# Altium footprint library ref-packages.PCBLIB: 1543 footprints (part 73 of 103) (continued)
## SQFP-R-20X28-176 [mil]
pads (176):
  rect 11.81x62.99 smd: 1(-501.97,-417.32) 2(-482.28,-417.32) 3(-462.6,-417.32) 4(-442.91,-417.32) 5(-423.23,-417.32) 6(-403.54,-417.32) 7(-383.86,-417.32) 8(-364.17,-417.32) 9(-344.49,-417.32) 10(-324.8,-417.32) 11(-305.12,-417.32) 12(-285.43,-417.32) 13(-265.75,-417.32) 14(-246.06,-417.32) 15(-226.38,-417.32) 16(-206.69,-417.32) 17(-187.01,-417.32) 18(-167.32,-417.32) 19(-147.64,-417.32) 20(-127.95,-417.32) 21(-108.27,-417.32) 22(-88.58,-417.32) 23(-68.9,-417.32) 24(-49.21,-417.32) 25(-29.53,-417.32) 26(-9.84,-417.32) 27(9.84,-417.32) 28(29.53,-417.32) 29(49.21,-417.32) 30(68.9,-417.32) 31(88.58,-417.32) 32(108.27,-417.32) 33(127.95,-417.32) 34(147.64,-417.32) 35(167.32,-417.32) 36(187.01,-417.32) 37(206.69,-417.32) 38(226.38,-417.32) 39(246.06,-417.32) 40(265.75,-417.32) 41(285.43,-417.32) 42(305.12,-417.32) 43(324.8,-417.32) 44(344.49,-417.32) 45(364.17,-417.32) 46(383.86,-417.32) 47(403.54,-417.32) 48(423.23,-417.32) 49(442.91,-417.32) 50(462.6,-417.32) 51(482.28,-417.32) 52(501.97,-417.32) 89(501.97,417.32) 90(482.28,417.32) 91(462.6,417.32) 92(442.91,417.32) 93(423.23,417.32) 94(403.54,417.32) 95(383.86,417.32) 96(364.17,417.32) 97(344.49,417.32) 98(324.8,417.32) 99(305.12,417.32) 100(285.43,417.32) 101(265.75,417.32) 102(246.06,417.32) 103(226.38,417.32) 104(206.69,417.32) 105(187.01,417.32) 106(167.32,417.32) 107(147.64,417.32) 108(127.95,417.32) 109(108.27,417.32) 110(88.58,417.32) 111(68.9,417.32) 112(49.21,417.32) 113(29.53,417.32) 114(9.84,417.32) 115(-9.84,417.32) 116(-29.53,417.32) 117(-49.21,417.32) 118(-68.9,417.32) 119(-88.58,417.32) 120(-108.27,417.32) 121(-127.95,417.32) 122(-147.64,417.32) 123(-167.32,417.32) 124(-187.01,417.32) 125(-206.69,417.32) 126(-226.38,417.32) 127(-246.06,417.32) 128(-265.75,417.32) 129(-285.43,417.32) 130(-305.12,417.32) 131(-324.8,417.32) 132(-344.49,417.32) 133(-364.17,417.32) 134(-383.86,417.32) 135(-403.54,417.32) 136(-423.23,417.32) 137(-442.91,417.32) 138(-462.6,417.32) 139(-482.28,417.32) 140(-501.97,417.32)
  rect 62.99x11.81 smd: 53(574.8,-344.49) 54(574.8,-324.8) 55(574.8,-305.12) 56(574.8,-285.43) 57(574.8,-265.75) 58(574.8,-246.06) 59(574.8,-226.38) 60(574.8,-206.69) 61(574.8,-187.01) 62(574.8,-167.32) 63(574.8,-147.64) 64(574.8,-127.95) 65(574.8,-108.27) 66(574.8,-88.58) 67(574.8,-68.9) 68(574.8,-49.21) 69(574.8,-29.53) 70(574.8,-9.84) 71(574.8,9.84) 72(574.8,29.53) 73(574.8,49.21) 74(574.8,68.9) 75(574.8,88.58) 76(574.8,108.27) 77(574.8,127.95) 78(574.8,147.64) 79(574.8,167.32) 80(574.8,187.01) 81(574.8,206.69) 82(574.8,226.38) 83(574.8,246.06) 84(574.8,265.75) 85(574.8,285.43) 86(574.8,305.12) 87(574.8,324.8) 88(574.8,344.49) 141(-574.8,344.49) 142(-574.8,324.8) 143(-574.8,305.12) 144(-574.8,285.43) 145(-574.8,265.75) 146(-574.8,246.06) 147(-574.8,226.38) 148(-574.8,206.69) 149(-574.8,187.01) 150(-574.8,167.32) 151(-574.8,147.64) 152(-574.8,127.95) 153(-574.8,108.27) 154(-574.8,88.58) 155(-574.8,68.9) 156(-574.8,49.21) 157(-574.8,29.53) 158(-574.8,9.84) 159(-574.8,-9.84) 160(-574.8,-29.53) 161(-574.8,-49.21) 162(-574.8,-68.9) 163(-574.8,-88.58) 164(-574.8,-108.27) 165(-574.8,-127.95) 166(-574.8,-147.64) 167(-574.8,-167.32) 168(-574.8,-187.01) 169(-574.8,-206.69) 170(-574.8,-226.38) 171(-574.8,-246.06) 172(-574.8,-265.75) 173(-574.8,-285.43) 174(-574.8,-305.12) 175(-574.8,-324.8) 176(-574.8,-344.49)
Top Overlay:
  circle w10: c-482.28,-334.65 r29.52
  lines w8: -534.25,-376.38 533.86,-376.38 533.86,376.38 -534.25,376.38 -534.25,-376.38
Mechanical 16:
  drawing of 180 lines, arcs and shapes, not listed
Mechanical 27:
  lines w7.87: -645.67,-468.5 -645.67,468.5 645.67,468.5 645.67,-468.5 -645.67,-468.5

## SQFP-R-20X28-184 [mil]
pads (184):
  rect 11.81x62.99 smd: 1(-521.65,-417.32) 2(-501.97,-417.32) 3(-482.28,-417.32) 4(-462.6,-417.32) 5(-442.91,-417.32) 6(-423.23,-417.32) 7(-403.54,-417.32) 8(-383.86,-417.32) 9(-364.17,-417.32) 10(-344.49,-417.32) 11(-324.8,-417.32) 12(-305.12,-417.32) 13(-285.43,-417.32) 14(-265.75,-417.32) 15(-246.06,-417.32) 16(-226.38,-417.32) 17(-206.69,-417.32) 18(-187.01,-417.32) 19(-167.32,-417.32) 20(-147.64,-417.32) 21(-127.95,-417.32) 22(-108.27,-417.32) 23(-88.58,-417.32) 24(-68.9,-417.32) 25(-49.21,-417.32) 26(-29.53,-417.32) 27(-9.84,-417.32) 28(9.84,-417.32) 29(29.53,-417.32) 30(49.21,-417.32) 31(68.9,-417.32) 32(88.58,-417.32) 33(108.27,-417.32) 34(127.95,-417.32) 35(147.64,-417.32) 36(167.32,-417.32) 37(187.01,-417.32) 38(206.69,-417.32) 39(226.38,-417.32) 40(246.06,-417.32) 41(265.75,-417.32) 42(285.43,-417.32) 43(305.12,-417.32) 44(324.8,-417.32) 45(344.49,-417.32) 46(364.17,-417.32) 47(383.86,-417.32) 48(403.54,-417.32) 49(423.23,-417.32) 50(442.91,-417.32) 51(462.6,-417.32) 52(482.28,-417.32) 53(501.97,-417.32) 54(521.65,-417.32) 93(521.65,417.32) 94(501.97,417.32) 95(482.28,417.32) 96(462.6,417.32) 97(442.91,417.32) 98(423.23,417.32) 99(403.54,417.32) 100(383.86,417.32) 101(364.17,417.32) 102(344.49,417.32) 103(324.8,417.32) 104(305.12,417.32) 105(285.43,417.32) 106(265.75,417.32) 107(246.06,417.32) 108(226.38,417.32) 109(206.69,417.32) 110(187.01,417.32) 111(167.32,417.32) 112(147.64,417.32) 113(127.95,417.32) 114(108.27,417.32) 115(88.58,417.32) 116(68.9,417.32) 117(49.21,417.32) 118(29.53,417.32) 119(9.84,417.32) 120(-9.84,417.32) 121(-29.53,417.32) 122(-49.21,417.32) 123(-68.9,417.32) 124(-88.58,417.32) 125(-108.27,417.32) 126(-127.95,417.32) 127(-147.64,417.32) 128(-167.32,417.32) 129(-187.01,417.32) 130(-206.69,417.32) 131(-226.38,417.32) 132(-246.06,417.32) 133(-265.75,417.32) 134(-285.43,417.32) 135(-305.12,417.32) 136(-324.8,417.32) 137(-344.49,417.32) 138(-364.17,417.32) 139(-383.86,417.32) 140(-403.54,417.32) 141(-423.23,417.32) 142(-442.91,417.32) 143(-462.6,417.32) 144(-482.28,417.32) 145(-501.97,417.32) 146(-521.65,417.32)
  rect 62.99x11.81 smd: 55(574.8,-364.17) 56(574.8,-344.49) 57(574.8,-324.8) 58(574.8,-305.12) 59(574.8,-285.43) 60(574.8,-265.75) 61(574.8,-246.06) 62(574.8,-226.38) 63(574.8,-206.69) 64(574.8,-187.01) 65(574.8,-167.32) 66(574.8,-147.64) 67(574.8,-127.95) 68(574.8,-108.27) 69(574.8,-88.58) 70(574.8,-68.9) 71(574.8,-49.21) 72(574.8,-29.53) 73(574.8,-9.84) 74(574.8,9.84) 75(574.8,29.53) 76(574.8,49.21) 77(574.8,68.9) 78(574.8,88.58) 79(574.8,108.27) 80(574.8,127.95) 81(574.8,147.64) 82(574.8,167.32) 83(574.8,187.01) 84(574.8,206.69) 85(574.8,226.38) 86(574.8,246.06) 87(574.8,265.75) 88(574.8,285.43) 89(574.8,305.12) 90(574.8,324.8) 91(574.8,344.49) 92(574.8,364.17) 147(-574.8,364.17) 148(-574.8,344.49) 149(-574.8,324.8) 150(-574.8,305.12) 151(-574.8,285.43) 152(-574.8,265.75) 153(-574.8,246.06) 154(-574.8,226.38) 155(-574.8,206.69) 156(-574.8,187.01) 157(-574.8,167.32) 158(-574.8,147.64) 159(-574.8,127.95) 160(-574.8,108.27) 161(-574.8,88.58) 162(-574.8,68.9) 163(-574.8,49.21) 164(-574.8,29.53) 165(-574.8,9.84) 166(-574.8,-9.84) 167(-574.8,-29.53) 168(-574.8,-49.21) 169(-574.8,-68.9) 170(-574.8,-88.58) 171(-574.8,-108.27) 172(-574.8,-127.95) 173(-574.8,-147.64) 174(-574.8,-167.32) 175(-574.8,-187.01) 176(-574.8,-206.69) 177(-574.8,-226.38) 178(-574.8,-246.06) 179(-574.8,-265.75) 180(-574.8,-285.43) 181(-574.8,-305.12) 182(-574.8,-324.8) 183(-574.8,-344.49) 184(-574.8,-364.17)
Top Overlay:
  circle w10: c-482.28,-334.65 r29.52
  lines w8: -534.25,-376.38 533.86,-376.38 533.86,376.38 -534.25,376.38 -534.25,-376.38
Mechanical 16:
  drawing of 188 lines, arcs and shapes, not listed
Mechanical 27:
  lines w7.87: -645.67,-468.5 -645.67,468.5 645.67,468.5 645.67,-468.5 -645.67,-468.5

## SQFP-R-20X28-224 [mm]
pads (224):
  rect 0.25x1.6 smd: 1(-13,-10.6) 2(-12.6,-10.6) 3(-12.2,-10.6) 4(-11.8,-10.6) 5(-11.4,-10.6) 6(-11,-10.6) 7(-10.6,-10.6) 8(-10.2,-10.6) 9(-9.8,-10.6) 10(-9.4,-10.6) 11(-9,-10.6) 12(-8.6,-10.6) 13(-8.2,-10.6) 14(-7.8,-10.6) 15(-7.4,-10.6) 16(-7,-10.6) 17(-6.6,-10.6) 18(-6.2,-10.6) 19(-5.8,-10.6) 20(-5.4,-10.6) 21(-5,-10.6) 22(-4.6,-10.6) 23(-4.2,-10.6) 24(-3.8,-10.6) 25(-3.4,-10.6) 26(-3,-10.6) 27(-2.6,-10.6) 28(-2.2,-10.6) 29(-1.8,-10.6) 30(-1.4,-10.6) 31(-1,-10.6) 32(-0.6,-10.6) 33(-0.2,-10.6) 34(0.2,-10.6) 35(0.6,-10.6) 36(1,-10.6) 37(1.4,-10.6) 38(1.8,-10.6) 39(2.2,-10.6) 40(2.6,-10.6) 41(3,-10.6) 42(3.4,-10.6) 43(3.8,-10.6) 44(4.2,-10.6) 45(4.6,-10.6) 46(5,-10.6) 47(5.4,-10.6) 48(5.8,-10.6) 49(6.2,-10.6) 50(6.6,-10.6) 51(7,-10.6) 52(7.4,-10.6) 53(7.8,-10.6) 54(8.2,-10.6) 55(8.6,-10.6) 56(9,-10.6) 57(9.4,-10.6) 58(9.8,-10.6) 59(10.2,-10.6) 60(10.6,-10.6) 61(11,-10.6) 62(11.4,-10.6) 63(11.8,-10.6) 64(12.2,-10.6) 65(12.6,-10.6) 66(13,-10.6) 113(13,10.6) 114(12.6,10.6) 115(12.2,10.6) 116(11.8,10.6) 117(11.4,10.6) 118(11,10.6) 119(10.6,10.6) 120(10.2,10.6) 121(9.8,10.6) 122(9.4,10.6) 123(9,10.6) 124(8.6,10.6) 125(8.2,10.6) 126(7.8,10.6) 127(7.4,10.6) 128(7,10.6) 129(6.6,10.6) 130(6.2,10.6) 131(5.8,10.6) 132(5.4,10.6) 133(5,10.6) 134(4.6,10.6) 135(4.2,10.6) 136(3.8,10.6) 137(3.4,10.6) 138(3,10.6) 139(2.6,10.6) 140(2.2,10.6) 141(1.8,10.6) 142(1.4,10.6) 143(1,10.6) 144(0.6,10.6) 145(0.2,10.6) 146(-0.2,10.6) 147(-0.6,10.6) 148(-1,10.6) 149(-1.4,10.6) 150(-1.8,10.6) 151(-2.2,10.6) 152(-2.6,10.6) 153(-3,10.6) 154(-3.4,10.6) 155(-3.8,10.6) 156(-4.2,10.6) 157(-4.6,10.6) 158(-5,10.6) 159(-5.4,10.6) 160(-5.8,10.6) 161(-6.2,10.6) 162(-6.6,10.6) 163(-7,10.6) 164(-7.4,10.6) 165(-7.8,10.6) 166(-8.2,10.6) 167(-8.6,10.6) 168(-9,10.6) 169(-9.4,10.6) 170(-9.8,10.6) 171(-10.2,10.6) 172(-10.6,10.6) 173(-11,10.6) 174(-11.4,10.6) 175(-11.8,10.6) 176(-12.2,10.6) 177(-12.6,10.6) 178(-13,10.6)
  rect 1.6x0.25 smd: 67(14.6,-9) 68(14.6,-8.6) 69(14.6,-8.2) 70(14.6,-7.8) 71(14.6,-7.4) 72(14.6,-7) 73(14.6,-6.6) 74(14.6,-6.2) 75(14.6,-5.8) 76(14.6,-5.4) 77(14.6,-5) 78(14.6,-4.6) 79(14.6,-4.2) 80(14.6,-3.8) 81(14.6,-3.4) 82(14.6,-3) 83(14.6,-2.6) 84(14.6,-2.2) 85(14.6,-1.8) 86(14.6,-1.4) 87(14.6,-1) 88(14.6,-0.6) 89(14.6,-0.2) 90(14.6,0.2) 91(14.6,0.6) 92(14.6,1) 93(14.6,1.4) 94(14.6,1.8) 95(14.6,2.2) 96(14.6,2.6) 97(14.6,3) 98(14.6,3.4) 99(14.6,3.8) 100(14.6,4.2) 101(14.6,4.6) 102(14.6,5) 103(14.6,5.4) 104(14.6,5.8) 105(14.6,6.2) 106(14.6,6.6) 107(14.6,7) 108(14.6,7.4) 109(14.6,7.8) 110(14.6,8.2) 111(14.6,8.6) 112(14.6,9) 179(-14.6,9) 180(-14.6,8.6) 181(-14.6,8.2) 182(-14.6,7.8) 183(-14.6,7.4) 184(-14.6,7) 185(-14.6,6.6) 186(-14.6,6.2) 187(-14.6,5.8) 188(-14.6,5.4) 189(-14.6,5) 190(-14.6,4.6) 191(-14.6,4.2) 192(-14.6,3.8) 193(-14.6,3.4) 194(-14.6,3) 195(-14.6,2.6) 196(-14.6,2.2) 197(-14.6,1.8) 198(-14.6,1.4) 199(-14.6,1) 200(-14.6,0.6) 201(-14.6,0.2) 202(-14.6,-0.2) 203(-14.6,-0.6) 204(-14.6,-1) 205(-14.6,-1.4) 206(-14.6,-1.8) 207(-14.6,-2.2) 208(-14.6,-2.6) 209(-14.6,-3) 210(-14.6,-3.4) 211(-14.6,-3.8) 212(-14.6,-4.2) 213(-14.6,-4.6) 214(-14.6,-5) 215(-14.6,-5.4) 216(-14.6,-5.8) 217(-14.6,-6.2) 218(-14.6,-6.6) 219(-14.6,-7) 220(-14.6,-7.4) 221(-14.6,-7.8) 222(-14.6,-8.2) 223(-14.6,-8.6) 224(-14.6,-9)
Top Overlay:
  circle w0.254: c-12.25,-8.5 r0.75
  lines w0.203: -13.57,-9.56 13.56,-9.56 13.56,9.56 -13.57,9.56 -13.57,-9.56
Mechanical 16:
  drawing of 228 lines, arcs and shapes, not listed
Mechanical 27:
  lines w0.2: -16.4,-11.9 -16.4,11.9 16.4,11.9 16.4,-11.9 -16.4,-11.9

## SQFP-R-20X28-232 [mm]
pads (232):
  rect 0.25x1.6 smd: 1(-13.4,-10.6) 2(-13,-10.6) 3(-12.6,-10.6) 4(-12.2,-10.6) 5(-11.8,-10.6) 6(-11.4,-10.6) 7(-11,-10.6) 8(-10.6,-10.6) 9(-10.2,-10.6) 10(-9.8,-10.6) 11(-9.4,-10.6) 12(-9,-10.6) 13(-8.6,-10.6) 14(-8.2,-10.6) 15(-7.8,-10.6) 16(-7.4,-10.6) 17(-7,-10.6) 18(-6.6,-10.6) 19(-6.2,-10.6) 20(-5.8,-10.6) 21(-5.4,-10.6) 22(-5,-10.6) 23(-4.6,-10.6) 24(-4.2,-10.6) 25(-3.8,-10.6) 26(-3.4,-10.6) 27(-3,-10.6) 28(-2.6,-10.6) 29(-2.2,-10.6) 30(-1.8,-10.6) 31(-1.4,-10.6) 32(-1,-10.6) 33(-0.6,-10.6) 34(-0.2,-10.6) 35(0.2,-10.6) 36(0.6,-10.6) 37(1,-10.6) 38(1.4,-10.6) 39(1.8,-10.6) 40(2.2,-10.6) 41(2.6,-10.6) 42(3,-10.6) 43(3.4,-10.6) 44(3.8,-10.6) 45(4.2,-10.6) 46(4.6,-10.6) 47(5,-10.6) 48(5.4,-10.6) 49(5.8,-10.6) 50(6.2,-10.6) 51(6.6,-10.6) 52(7,-10.6) 53(7.4,-10.6) 54(7.8,-10.6) 55(8.2,-10.6) 56(8.6,-10.6) 57(9,-10.6) 58(9.4,-10.6) 59(9.8,-10.6) 60(10.2,-10.6) 61(10.6,-10.6) 62(11,-10.6) 63(11.4,-10.6) 64(11.8,-10.6) 65(12.2,-10.6) 66(12.6,-10.6) 67(13,-10.6) 68(13.4,-10.6) 117(13.4,10.6) 118(13,10.6) 119(12.6,10.6) 120(12.2,10.6) 121(11.8,10.6) 122(11.4,10.6) 123(11,10.6) 124(10.6,10.6) 125(10.2,10.6) 126(9.8,10.6) 127(9.4,10.6) 128(9,10.6) 129(8.6,10.6) 130(8.2,10.6) 131(7.8,10.6) 132(7.4,10.6) 133(7,10.6) 134(6.6,10.6) 135(6.2,10.6) 136(5.8,10.6) 137(5.4,10.6) 138(5,10.6) 139(4.6,10.6) 140(4.2,10.6) 141(3.8,10.6) 142(3.4,10.6) 143(3,10.6) 144(2.6,10.6) 145(2.2,10.6) 146(1.8,10.6) 147(1.4,10.6) 148(1,10.6) 149(0.6,10.6) 150(0.2,10.6) 151(-0.2,10.6) 152(-0.6,10.6) 153(-1,10.6) 154(-1.4,10.6) 155(-1.8,10.6) 156(-2.2,10.6) 157(-2.6,10.6) 158(-3,10.6) 159(-3.4,10.6) 160(-3.8,10.6) 161(-4.2,10.6) 162(-4.6,10.6) 163(-5,10.6) 164(-5.4,10.6) 165(-5.8,10.6) 166(-6.2,10.6) 167(-6.6,10.6) 168(-7,10.6) 169(-7.4,10.6) 170(-7.8,10.6) 171(-8.2,10.6) 172(-8.6,10.6) 173(-9,10.6) 174(-9.4,10.6) 175(-9.8,10.6) 176(-10.2,10.6) 177(-10.6,10.6) 178(-11,10.6) 179(-11.4,10.6) 180(-11.8,10.6) 181(-12.2,10.6) 182(-12.6,10.6) 183(-13,10.6) 184(-13.4,10.6)
  rect 1.6x0.25 smd: 69(14.6,-9.4) 70(14.6,-9) 71(14.6,-8.6) 72(14.6,-8.2) 73(14.6,-7.8) 74(14.6,-7.4) 75(14.6,-7) 76(14.6,-6.6) 77(14.6,-6.2) 78(14.6,-5.8) 79(14.6,-5.4) 80(14.6,-5) 81(14.6,-4.6) 82(14.6,-4.2) 83(14.6,-3.8) 84(14.6,-3.4) 85(14.6,-3) 86(14.6,-2.6) 87(14.6,-2.2) 88(14.6,-1.8) 89(14.6,-1.4) 90(14.6,-1) 91(14.6,-0.6) 92(14.6,-0.2) 93(14.6,0.2) 94(14.6,0.6) 95(14.6,1) 96(14.6,1.4) 97(14.6,1.8) 98(14.6,2.2) 99(14.6,2.6) 100(14.6,3) 101(14.6,3.4) 102(14.6,3.8) 103(14.6,4.2) 104(14.6,4.6) 105(14.6,5) 106(14.6,5.4) 107(14.6,5.8) 108(14.6,6.2) 109(14.6,6.6) 110(14.6,7) 111(14.6,7.4) 112(14.6,7.8) 113(14.6,8.2) 114(14.6,8.6) 115(14.6,9) 116(14.6,9.4) 185(-14.6,9.4) 186(-14.6,9) 187(-14.6,8.6) 188(-14.6,8.2) 189(-14.6,7.8) 190(-14.6,7.4) 191(-14.6,7) 192(-14.6,6.6) 193(-14.6,6.2) 194(-14.6,5.8) 195(-14.6,5.4) 196(-14.6,5) 197(-14.6,4.6) 198(-14.6,4.2) 199(-14.6,3.8) 200(-14.6,3.4) 201(-14.6,3) 202(-14.6,2.6) 203(-14.6,2.2) 204(-14.6,1.8) 205(-14.6,1.4) 206(-14.6,1) 207(-14.6,0.6) 208(-14.6,0.2) 209(-14.6,-0.2) 210(-14.6,-0.6) 211(-14.6,-1) 212(-14.6,-1.4) 213(-14.6,-1.8) 214(-14.6,-2.2) 215(-14.6,-2.6) 216(-14.6,-3) 217(-14.6,-3.4) 218(-14.6,-3.8) 219(-14.6,-4.2) 220(-14.6,-4.6) 221(-14.6,-5) 222(-14.6,-5.4) 223(-14.6,-5.8) 224(-14.6,-6.2) 225(-14.6,-6.6) 226(-14.6,-7) 227(-14.6,-7.4) 228(-14.6,-7.8) 229(-14.6,-8.2) 230(-14.6,-8.6) 231(-14.6,-9) 232(-14.6,-9.4)
Top Overlay:
  circle w0.254: c-12.25,-8.5 r0.75
  lines w0.203: -13.57,-9.56 13.56,-9.56 13.56,9.56 -13.57,9.56 -13.57,-9.56
Mechanical 16:
  drawing of 236 lines, arcs and shapes, not listed
Mechanical 27:
  lines w0.2: -16.4,-11.9 -16.4,11.9 16.4,11.9 16.4,-11.9 -16.4,-11.9

## SQFP-R-20X28-300 [mm]
pads (300):
  rect 0.17x1.6 smd: 1(-13.05,-10.6) 2(-12.75,-10.6) 3(-12.45,-10.6) 4(-12.15,-10.6) 5(-11.85,-10.6) 6(-11.55,-10.6) 7(-11.25,-10.6) 8(-10.95,-10.6) 9(-10.65,-10.6) 10(-10.35,-10.6) 11(-10.05,-10.6) 12(-9.75,-10.6) 13(-9.45,-10.6) 14(-9.15,-10.6) 15(-8.85,-10.6) 16(-8.55,-10.6) 17(-8.25,-10.6) 18(-7.95,-10.6) 19(-7.65,-10.6) 20(-7.35,-10.6) 21(-7.05,-10.6) 22(-6.75,-10.6) 23(-6.45,-10.6) 24(-6.15,-10.6) 25(-5.85,-10.6) 26(-5.55,-10.6) 27(-5.25,-10.6) 28(-4.95,-10.6) 29(-4.65,-10.6) 30(-4.35,-10.6) 31(-4.05,-10.6) 32(-3.75,-10.6) 33(-3.45,-10.6) 34(-3.15,-10.6) 35(-2.85,-10.6) 36(-2.55,-10.6) 37(-2.25,-10.6) 38(-1.95,-10.6) 39(-1.65,-10.6) 40(-1.35,-10.6) 41(-1.05,-10.6) 42(-0.75,-10.6) 43(-0.45,-10.6) 44(-0.15,-10.6) 45(0.15,-10.6) 46(0.45,-10.6) 47(0.75,-10.6) 48(1.05,-10.6) 49(1.35,-10.6) 50(1.65,-10.6) 51(1.95,-10.6) 52(2.25,-10.6) 53(2.55,-10.6) 54(2.85,-10.6) 55(3.15,-10.6) 56(3.45,-10.6) 57(3.75,-10.6) 58(4.05,-10.6) 59(4.35,-10.6) 60(4.65,-10.6) 61(4.95,-10.6) 62(5.25,-10.6) 63(5.55,-10.6) 64(5.85,-10.6) 65(6.15,-10.6) 66(6.45,-10.6) 67(6.75,-10.6) 68(7.05,-10.6) 69(11.55,-10.6) 70(7.35,-10.6) 71(7.65,-10.6) 72(7.95,-10.6) 73(8.25,-10.6) 74(8.55,-10.6) 75(8.85,-10.6) 76(9.15,-10.6) 77(9.45,-10.6) 78(9.75,-10.6) 79(10.05,-10.6) 80(10.35,-10.6) 81(10.65,-10.6) 82(10.95,-10.6) 83(11.25,-10.6) 84(11.85,-10.6) 85(12.15,-10.6) 86(12.45,-10.6) 87(12.75,-10.6) 88(13.05,-10.6) 151(13.05,10.6) 152(12.75,10.6) 153(12.45,10.6) 154(12.15,10.6) 155(11.85,10.6) 156(11.55,10.6) 157(11.25,10.6) 158(10.95,10.6) 159(10.65,10.6) 160(10.35,10.6) 161(10.05,10.6) 162(9.75,10.6) 163(9.45,10.6) 164(9.15,10.6) 165(8.85,10.6) 166(8.55,10.6) 167(8.25,10.6) 168(7.95,10.6) 169(7.65,10.6) 170(7.35,10.6) 171(7.05,10.6) 172(6.75,10.6) 173(6.45,10.6) 174(6.15,10.6) 175(5.85,10.6) 176(5.55,10.6) 177(5.25,10.6) 178(4.95,10.6) 179(4.65,10.6) 180(4.35,10.6) 181(4.05,10.6) 182(3.75,10.6) 183(3.45,10.6) 184(3.15,10.6) 185(2.85,10.6) 186(2.55,10.6) 187(2.25,10.6) 188(1.95,10.6) 189(1.65,10.6) 190(1.35,10.6) 191(1.05,10.6) 192(0.75,10.6) 193(0.45,10.6) 194(0.15,10.6) 195(-0.15,10.6) 196(-0.45,10.6) 197(-0.75,10.6) 198(-1.05,10.6) 199(-1.35,10.6) 200(-1.65,10.6) 201(-1.95,10.6) 202(-2.25,10.6) 203(-2.55,10.6) 204(-2.85,10.6) 205(-3.15,10.6) 206(-3.45,10.6) 207(-3.75,10.6) 208(-4.05,10.6) 209(-4.35,10.6) 210(-4.65,10.6) 211(-4.95,10.6) 212(-5.25,10.6) 213(-5.55,10.6) 214(-5.85,10.6) 215(-6.15,10.6) 216(-6.45,10.6) 217(-6.75,10.6) 218(-7.05,10.6) 219(-7.35,10.6) 220(-7.65,10.6) 221(-7.95,10.6) 222(-8.25,10.6) 223(-8.55,10.6) 224(-8.85,10.6) 225(-9.15,10.6) 226(-9.45,10.6) 227(-9.75,10.6) 228(-10.05,10.6) 229(-10.35,10.6) 230(-10.65,10.6) 231(-10.95,10.6) 232(-11.25,10.6) 233(-11.55,10.6) 234(-11.85,10.6) 235(-12.15,10.6) 236(-12.45,10.6) 237(-12.75,10.6) 238(-13.05,10.6)
  rect 1.6x0.17 smd: 89(14.6,-9.15) 90(14.6,-8.85) 91(14.6,-8.55) 92(14.6,-8.25) 93(14.6,-7.95) 94(14.6,-7.65) 95(14.6,-7.35) 96(14.6,-7.05) 97(14.6,-6.75) 98(14.6,-6.45) 99(14.6,-6.15) 100(14.6,-5.85) 101(14.6,-5.55) 102(14.6,-5.25) 103(14.6,-4.95) 104(14.6,-4.65) 105(14.6,-4.35) 106(14.6,-4.05) 107(14.6,-3.75) 108(14.6,-3.45) 109(14.6,-3.15) 110(14.6,-2.85) 111(14.6,-2.55) 112(14.6,-2.25) 113(14.6,-1.95) 114(14.6,-1.65) 115(14.6,-1.35) 116(14.6,-1.05) 117(14.6,-0.75) 118(14.6,-0.45) 119(14.6,-0.15) 120(14.6,0.15) 121(14.6,0.45) 122(14.6,0.75) 123(14.6,1.05) 124(14.6,1.35) 125(14.6,1.65) 126(14.6,1.95) 127(14.6,2.25) 128(14.6,2.55) 129(14.6,2.85) 130(14.6,3.15) 131(14.6,3.45) 132(14.6,3.75) 133(14.6,4.05) 134(14.6,4.35) 135(14.6,4.65) 136(14.6,4.95) 137(14.6,5.25) 138(14.6,5.55) 139(14.6,5.85) 140(14.6,6.15) 141(14.6,6.45) 142(14.6,6.75) 143(14.6,7.05) 144(14.6,7.35) 145(14.6,7.65) 146(14.6,7.95) 147(14.6,8.25) 148(14.6,8.55) 149(14.6,8.85) 150(14.6,9.15) 239(-14.6,9.15) 240(-14.6,8.85) 241(-14.6,8.55) 242(-14.6,8.25) 243(-14.6,7.95) 244(-14.6,7.65) 245(-14.6,7.35) 246(-14.6,7.05) 247(-14.6,6.75) 248(-14.6,6.45) 249(-14.6,6.15) 250(-14.6,5.85) 251(-14.6,5.55) 252(-14.6,5.25) 253(-14.6,4.95) 254(-14.6,4.65) 255(-14.6,4.35) 256(-14.6,4.05) 257(-14.6,3.75) 258(-14.6,3.45) 259(-14.6,3.15) 260(-14.6,2.85) 261(-14.6,2.55) 262(-14.6,2.25) 263(-14.6,1.95) 264(-14.6,1.65) 265(-14.6,1.35) 266(-14.6,1.05) 267(-14.6,0.75) 268(-14.6,0.45) 269(-14.6,0.15) 270(-14.6,-0.15) 271(-14.6,-0.45) 272(-14.6,-0.75) 273(-14.6,-1.05) 274(-14.6,-1.35) 275(-14.6,-1.65) 276(-14.6,-1.95) 277(-14.6,-2.25) 278(-14.6,-2.55) 279(-14.6,-2.85) 280(-14.6,-3.15) 281(-14.6,-3.45) 282(-14.6,-3.75) 283(-14.6,-4.05) 284(-14.6,-4.35) 285(-14.6,-4.65) 286(-14.6,-4.95) 287(-14.6,-5.25) 288(-14.6,-5.55) 289(-14.6,-5.85) 290(-14.6,-6.15) 291(-14.6,-6.45) 292(-14.6,-6.75) 293(-14.6,-7.05) 294(-14.6,-7.35) 295(-14.6,-7.65) 296(-14.6,-7.95) 297(-14.6,-8.25) 298(-14.6,-8.55) 299(-14.6,-8.85) 300(-14.6,-9.15)
Top Overlay:
  circle w0.254: c-12.25,-8.5 r0.75
  lines w0.203: -13.57,-9.56 13.56,-9.56 13.56,9.56 -13.57,9.56 -13.57,-9.56
Mechanical 16:
  drawing of 304 lines, arcs and shapes, not listed
Mechanical 27:
  lines w0.2: -16.4,-11.9 -16.4,11.9 16.4,11.9 16.4,-11.9 -16.4,-11.9

## SQFP-R-20X28-308 [mm]
pads (308):
  rect 0.17x1.6 smd: 1(-13.35,-10.6) 2(-13.05,-10.6) 3(-12.75,-10.6) 4(-12.45,-10.6) 5(-12.15,-10.6) 6(-11.85,-10.6) 7(-11.55,-10.6) 8(-11.25,-10.6) 9(-10.95,-10.6) 10(-10.65,-10.6) 11(-10.35,-10.6) 12(-10.05,-10.6) 13(-9.75,-10.6) 14(-9.45,-10.6) 15(-9.15,-10.6) 16(-8.85,-10.6) 17(-8.55,-10.6) 18(-8.25,-10.6) 19(-7.95,-10.6) 20(-7.65,-10.6) 21(-7.35,-10.6) 22(-7.05,-10.6) 23(-6.75,-10.6) 24(-6.45,-10.6) 25(-6.15,-10.6) 26(-5.85,-10.6) 27(-5.55,-10.6) 28(-5.25,-10.6) 29(-4.95,-10.6) 30(-4.65,-10.6) 31(-4.35,-10.6) 32(-4.05,-10.6) 33(-3.75,-10.6) 34(-3.45,-10.6) 35(-3.15,-10.6) 36(-2.85,-10.6) 37(-2.55,-10.6) 38(-2.25,-10.6) 39(-1.95,-10.6) 40(-1.65,-10.6) 41(-1.35,-10.6) 42(-1.05,-10.6) 43(-0.75,-10.6) 44(-0.45,-10.6) 45(-0.15,-10.6) 46(0.15,-10.6) 47(0.45,-10.6) 48(0.75,-10.6) 49(1.05,-10.6) 50(1.35,-10.6) 51(1.65,-10.6) 52(1.95,-10.6) 53(2.25,-10.6) 54(2.55,-10.6) 55(2.85,-10.6) 56(3.15,-10.6) 57(3.45,-10.6) 58(3.75,-10.6) 59(4.05,-10.6) 60(4.35,-10.6) 61(4.65,-10.6) 62(4.95,-10.6) 63(5.25,-10.6) 64(5.55,-10.6) 65(5.85,-10.6) 66(6.15,-10.6) 67(6.45,-10.6) 68(6.75,-10.6) 69(11.25,-10.6) 70(7.05,-10.6) 71(7.35,-10.6) 72(7.65,-10.6) 73(7.95,-10.6) 74(8.25,-10.6) 75(8.55,-10.6) 76(8.85,-10.6) 77(9.15,-10.6) 78(9.45,-10.6) 79(9.75,-10.6) 80(10.05,-10.6) 81(10.35,-10.6) 82(10.65,-10.6) 83(10.95,-10.6) 84(11.55,-10.6) 85(11.85,-10.6) 86(12.15,-10.6) 87(12.45,-10.6) 88(12.75,-10.6) 89(13.05,-10.6) 90(13.35,-10.6) 155(13.35,10.6) 156(13.05,10.6) 157(12.75,10.6) 158(12.45,10.6) 159(12.15,10.6) 160(11.85,10.6) 161(11.55,10.6) 162(11.25,10.6) 163(10.95,10.6) 164(10.65,10.6) 165(10.35,10.6) 166(10.05,10.6) 167(9.75,10.6) 168(9.45,10.6) 169(9.15,10.6) 170(8.85,10.6) 171(8.55,10.6) 172(8.25,10.6) 173(7.95,10.6) 174(7.65,10.6) 175(7.35,10.6) 176(7.05,10.6) 177(6.75,10.6) 178(6.45,10.6) 179(6.15,10.6) 180(5.85,10.6) 181(5.55,10.6) 182(5.25,10.6) 183(4.95,10.6) 184(4.65,10.6) 185(4.35,10.6) 186(4.05,10.6) 187(3.75,10.6) 188(3.45,10.6) 189(3.15,10.6) 190(2.85,10.6) 191(2.55,10.6) 192(2.25,10.6) 193(1.95,10.6) 194(1.65,10.6) 195(1.35,10.6) 196(1.05,10.6) 197(0.75,10.6) 198(0.45,10.6) 199(0.15,10.6) 200(-0.15,10.6) 201(-0.45,10.6) 202(-0.75,10.6) 203(-1.05,10.6) 204(-1.35,10.6) 205(-1.65,10.6) 206(-1.95,10.6) 207(-2.25,10.6) 208(-2.55,10.6) 209(-2.85,10.6) 210(-3.15,10.6) 211(-3.45,10.6) 212(-3.75,10.6) 213(-4.05,10.6) 214(-4.35,10.6) 215(-4.65,10.6) 216(-4.95,10.6) 217(-5.25,10.6) 218(-5.55,10.6) 219(-5.85,10.6) 220(-6.15,10.6) 221(-6.45,10.6) 222(-6.75,10.6) 223(-7.05,10.6) 224(-7.35,10.6) 225(-7.65,10.6) 226(-7.95,10.6) 227(-8.25,10.6) 228(-8.55,10.6) 229(-8.85,10.6) 230(-9.15,10.6) 231(-9.45,10.6) 232(-9.75,10.6) 233(-10.05,10.6) 234(-10.35,10.6) 235(-10.65,10.6) 236(-10.95,10.6) 237(-11.25,10.6) 238(-11.55,10.6) 239(-11.85,10.6) 240(-12.15,10.6) 241(-12.45,10.6) 242(-12.75,10.6) 243(-13.05,10.6) 244(-13.35,10.6)
  rect 1.6x0.17 smd: 91(14.6,-9.45) 92(14.6,-9.15) 93(14.6,-8.85) 94(14.6,-8.55) 95(14.6,-8.25) 96(14.6,-7.95) 97(14.6,-7.65) 98(14.6,-7.35) 99(14.6,-7.05) 100(14.6,-6.75) 101(14.6,-6.45) 102(14.6,-6.15) 103(14.6,-5.85) 104(14.6,-5.55) 105(14.6,-5.25) 106(14.6,-4.95) 107(14.6,-4.65) 108(14.6,-4.35) 109(14.6,-4.05) 110(14.6,-3.75) 111(14.6,-3.45) 112(14.6,-3.15) 113(14.6,-2.85) 114(14.6,-2.55) 115(14.6,-2.25) 116(14.6,-1.95) 117(14.6,-1.65) 118(14.6,-1.35) 119(14.6,-1.05) 120(14.6,-0.75) 121(14.6,-0.45) 122(14.6,-0.15) 123(14.6,0.15) 124(14.6,0.45) 125(14.6,0.75) 126(14.6,1.05) 127(14.6,1.35) 128(14.6,1.65) 129(14.6,1.95) 130(14.6,2.25) 131(14.6,2.55) 132(14.6,2.85) 133(14.6,3.15) 134(14.6,3.45) 135(14.6,3.75) 136(14.6,4.05) 137(14.6,4.35) 138(14.6,4.65) 139(14.6,4.95) 140(14.6,5.25) 141(14.6,5.55) 142(14.6,5.85) 143(14.6,6.15) 144(14.6,6.45) 145(14.6,6.75) 146(14.6,7.05) 147(14.6,7.35) 148(14.6,7.65) 149(14.6,7.95) 150(14.6,8.25) 151(14.6,8.55) 152(14.6,8.85) 153(14.6,9.15) 154(14.6,9.45) 245(-14.6,9.45) 246(-14.6,9.15) 247(-14.6,8.85) 248(-14.6,8.55) 249(-14.6,8.25) 250(-14.6,7.95) 251(-14.6,7.65) 252(-14.6,7.35) 253(-14.6,7.05) 254(-14.6,6.75) 255(-14.6,6.45) 256(-14.6,6.15) 257(-14.6,5.85) 258(-14.6,5.55) 259(-14.6,5.25) 260(-14.6,4.95) 261(-14.6,4.65) 262(-14.6,4.35) 263(-14.6,4.05) 264(-14.6,3.75) 265(-14.6,3.45) 266(-14.6,3.15) 267(-14.6,2.85) 268(-14.6,2.55) 269(-14.6,2.25) 270(-14.6,1.95) 271(-14.6,1.65) 272(-14.6,1.35) 273(-14.6,1.05) 274(-14.6,0.75) 275(-14.6,0.45) 276(-14.6,0.15) 277(-14.6,-0.15) 278(-14.6,-0.45) 279(-14.6,-0.75) 280(-14.6,-1.05) 281(-14.6,-1.35) 282(-14.6,-1.65) 283(-14.6,-1.95) 284(-14.6,-2.25) 285(-14.6,-2.55) 286(-14.6,-2.85) 287(-14.6,-3.15) 288(-14.6,-3.45) 289(-14.6,-3.75) 290(-14.6,-4.05) 291(-14.6,-4.35) 292(-14.6,-4.65) 293(-14.6,-4.95) 294(-14.6,-5.25) 295(-14.6,-5.55) 296(-14.6,-5.85) 297(-14.6,-6.15) 298(-14.6,-6.45) 299(-14.6,-6.75) 300(-14.6,-7.05) 301(-14.6,-7.35) 302(-14.6,-7.65) 303(-14.6,-7.95) 304(-14.6,-8.25) 305(-14.6,-8.55) 306(-14.6,-8.85) 307(-14.6,-9.15) 308(-14.6,-9.45)
Top Overlay:
  circle w0.254: c-12.25,-8.5 r0.75
  lines w0.203: -13.57,-9.56 13.56,-9.56 13.56,9.56 -13.57,9.56 -13.57,-9.56
Mechanical 16:
  drawing of 312 lines, arcs and shapes, not listed
Mechanical 27:
  lines w0.2: -16.4,-11.9 -16.4,11.9 16.4,11.9 16.4,-11.9 -16.4,-11.9